# Altium footprint library std-th.PcbLib: 245 footprints (part 7 of 16)
Each footprint in its own frame and in the unit in brackets; x right, y up, seen from the top. Pads: shape width x height; smd on the part's side, far side on the other; paste and mask are expansions set on the pad; w line width, h text height; cw(c..) or ccw(c..) is an arc to the next point about the centre after c.
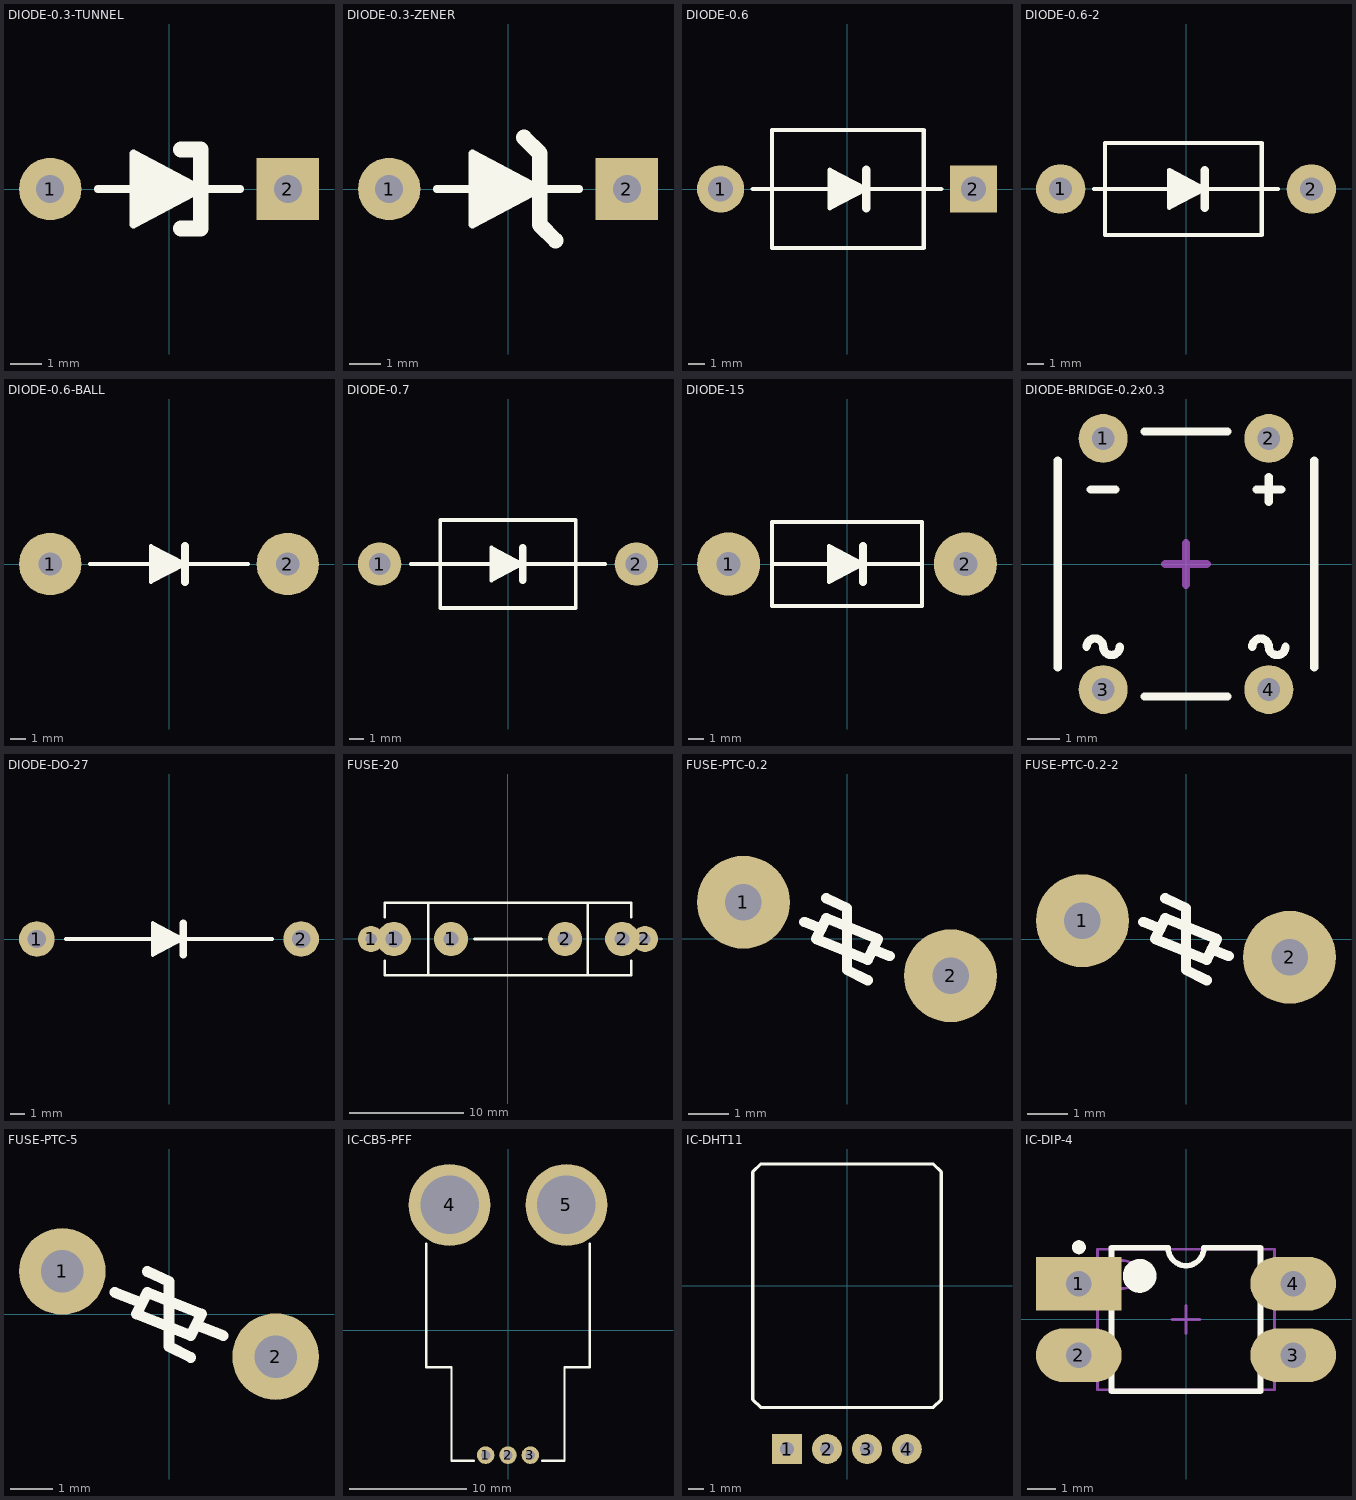
[diagram p6: the footprints below, top view; thin cyan lines are the x and y axes]

## DIODE-0.3-TUNNEL [mm] "Axial Tunnel Diode, Leads 0.3 inch spacing"
height 2.8
pads (2):
  round 2 hole 0.9: 1(-3.81,0)
  rect 2x2 hole 0.9: 2(3.81,0)
Top Overlay:
  region: -1.143,1.143 1.016,0 -1.143,-1.143
  lines w0.254: -2.286,0 2.286,0 ; -1.143,-1.143 -1.143,1.143 1.016,0 -1.143,-1.143
  lines w0.508: 0.381,-1.27 1.016,-1.27 1.016,1.27 0.381,1.27
3D body: height 3.06, standoff -1.27, extent -4.204,-1.333 4.204,1.334

## DIODE-0.3-ZENER [mm] "Axial Zener Diode, Leads 0.3 inch spacing"
height 2.8
pads (2):
  round 2 hole 0.9: 1(-3.81,0)
  rect 2x2 hole 0.9: 2(3.81,0)
Top Overlay:
  region: -1.143,1.143 1.016,0 -1.143,-1.143
  lines w0.254: -2.286,0 2.286,0 ; -1.143,-1.143 -1.143,1.143 1.016,0 -1.143,-1.143
  lines w0.508: 0.508,1.651 1.016,1.143 1.016,-1.143 1.524,-1.651
3D body: height 2.46, standoff -2, extent -4.07,-0.96 4.07,0.96

## DIODE-0.6 [mil] "Diode, Axial Diode, Leads 0.6 inch spacing"
height 275.59
pads (2):
  round 110 hole 59.06: 1(-295.28,0)
  rect 110x110 hole 59.06: 2(295.28,0)
Top Overlay:
  region: -40,45 45,0 -40,-45
  lines w10: -220,0 -177.17,0 ; -182.01,0 192,-0.01 ; 177.17,0 220,0 ; -175,-137.52 179.33,-137.52 179.33,137.52 -175,137.52 -175,-137.52 ; -40,-45 -40,45 45,0 -40,-45
  lines w20: 45,-45 45,45
3D body: height 226.38, standoff -59.06, extent -321.85,-88.59 321.85,88.58
3D body: height 274.5, standoff 0, extent -175,-137.52 179.33,137.52
3D body: height 275.09, standoff -0.2, extent 115,-137.92 154.37,137.92

## DIODE-0.6-2 [mm] "DO-201AD"
height 5
pads (2):
  round 3 hole 1.4: 1(-7.62,0) 2(7.62,0)
Top Overlay:
  region: -1.016,1.149 1.143,0.006 -1.016,-1.137
  lines w0.254: -5.588,0.006 -4.5,0.006 ; -5.461,0.006 -4.92,0 ; -4.623,0.006 4.877,0.006 ; 4.5,0.006 5.588,0.006 ; 4.61,0.006 5.334,0.006 ; -4.92,-2.8 -4.92,2.8 4.61,2.8 4.61,-2.788 -4.92,-2.8 ; -1.016,-1.137 -1.016,1.149 1.143,0.006 -1.016,-1.137
  lines w0.508: 1.143,-1.137 1.143,1.149
3D body: height 7.6, standoff -4, extent -8.28,-2.8 8.28,2.8

## DIODE-0.6-BALL [mm] "Ball Power diode, 600 mil pitch"
pads (2):
  round 4 hole 1.5: 1(-7.62,0) 2(7.62,0)
Top Overlay:
  region: -1.143,1.143 1.016,0 -1.143,-1.143
  lines w0.254: -5.08,0 5.08,0 ; -1.143,-1.143 -1.143,1.143 1.016,0 -1.143,-1.143
  lines w0.508: 1.016,-1.143 1.016,1.143
3D body: height 5.25, standoff -2, extent -8.175,-2.25 8.175,2.25

## DIODE-0.7 [mm] "Power diode, 700 mil pitch"
pads (2):
  round 3 hole 1.5: 1(-8.89,0) 2(8.89,0)
Top Overlay:
  region: -1.143,1.143 1.016,0 -1.143,-1.143
  lines w0.254: -6.731,0 6.731,0 ; -4.699,-3.048 -4.699,3.048 4.699,3.048 4.699,-3.048 -4.699,-3.048 ; -1.143,-1.143 1.016,0 -1.143,1.143 -1.143,-1.143
  lines w0.508: 1.016,-1.143 1.016,1.143
3D body: height 6.22, standoff -2, extent -9.525,-3.112 9.525,3.113

## DIODE-15 [mm] "Power diode, 15 mm pitch"
pads (2):
  round 4 hole 1.5: 1(-7.5,0) 2(7.5,0)
Top Overlay:
  region: -1.143,1.143 1.016,0 -1.143,-1.143
  lines w0.254: -4.75,0 4.75,0 ; -4.75,-2.667 -4.75,2.667 4.75,2.667 4.75,-2.667 -4.75,-2.667 ; -1.143,-1.143 -1.143,1.143 1.016,0 -1.143,-1.143
  lines w0.508: 1.016,-1.143 1.016,1.143
3D body: height 5.3, standoff -3.35, extent -8.15,-2.65 8.15,2.65

## DIODE-BRIDGE-0.2x0.3 [mm] "Bridge rectifier, 200 mil pitch, 300 mil row spacing"
height 8
pads (4):
  round 1.5 hole 0.7: 1(-2.54,3.85) 2(2.54,3.85) 3(-2.54,-3.85) 4(2.54,-3.85)
Top Overlay:
  lines w0.254: -3.937,-3.175 -3.937,3.175 ; -3.048,-2.54 cw(c-2.794,-2.54) -2.54,-2.54 ccw(c-2.286,-2.54) -2.032,-2.54 ; -2.921,2.286 -2.159,2.286 ; -1.27,-4.064 1.27,-4.064 ; -1.27,4.064 1.27,4.064 ; 2.032,-2.54 cw(c2.286,-2.54) 2.54,-2.54 ccw(c2.794,-2.54) 3.048,-2.54 ; 2.159,2.286 2.921,2.286 ; 2.54,1.905 2.54,2.667 ; 3.937,-3.175 3.937,3.175
Mechanical 15:
  lines w0.254: -0.635,0 0.635,0 ; 0,-0.635 0,0.635
3D body: height 3.8, standoff -2.7, extent -3.85,-3.993 3.85,3.99

## DIODE-DO-27 [mm] "Diode, DO-27 / DO-201AD"
height 5
pads (2):
  round 2.54 hole 1.3: 1(-9.42,0) 2(9.42,0)
Top Overlay:
  region: -1.143,1.143 1.016,0 -1.143,-1.143
  lines w0.254: -7.366,0 7.366,0 ; -1.143,-1.143 -1.143,1.143 1.016,0 -1.143,-1.143
  lines w0.508: 1.016,-1.143 1.016,1.143
3D body: height 5.99, standoff -3.62, extent -10.07,-2.82 10.07,2.82

## FUSE-20 [mm] "Fuse, through hole, 4 pin, 10 mm pitch"
height 8
pads (6):
  round 2.286 hole 1: 1(-12,0) 2(12,0)
  round 3 hole 1.5: 1(-10,0)
  round 3 hole 1.3: 1(-5,0) 2(5,0) 2(10,0)
Top Overlay:
  lines w0.254: -10.795,-1.905 -10.795,-3.175 10.795,-3.175 10.795,-1.905 ; -10.795,1.905 -10.795,3.175 10.795,3.175 10.795,1.905 ; -6.985,-3.175 -6.985,3.175 ; -2.921,0 2.921,0 ; 6.985,-3.175 6.985,3.175
3D body: height 9.59, standoff -3.31, extent -10.639,-3.142 10.639,3.048

## FUSE-PTC-0.2 [mil] "Polyfuse, 200 mil pitch"
height 314.96
pads (2):
  round 90 hole 35.43: 1(-100.4,35.63) 2(100.39,-35.63)
Top Overlay:
  lines w10: -41.38,16.55 -25,10 ; -20,39.37 0,30 0,-30 20,-40 ; 25,-10 41.38,-16.55 ; -30,0 -20,20 30,0 20,-20 -30,0
3D body: height 720.47, standoff -299.21, extent -236.21,-55.5 236.23,55.51

## FUSE-PTC-0.2-2 [mil] "Polyfuse, 200 mil pitch"
height 314.96
pads (2):
  round 90 hole 35.43: 1(-100.39,17.72) 2(100.39,-17.72)
Top Overlay:
  lines w10: -41.38,16.55 -25,10 ; -20,39.37 0,30 0,-30 20,-40 ; 25,-10 41.38,-16.55 ; -30,0 20,-20 30,0 -20,20 -30,0
3D body: height 588.58, standoff -128.76, extent -145.66,-33.46 145.68,33.48

## FUSE-PTC-5 [mm] "Resettable fuse, PTC, 5 mm pitch"
height 15
pads (2):
  round 2.032 hole 1: 1(-2.5,1) 2(2.5,-1)
Top Overlay:
  lines w0.254: -1.27,0.508 -0.635,0.254 ; -0.508,1 0,0.762 0,-0.762 0.508,-1.016 ; 0.635,-0.254 1.27,-0.508 ; -0.762,0 -0.508,0.508 0.762,0 0.508,-0.508 -0.762,0
3D body: height 15.68, standoff -3.02, extent -5.1,-1.5 5.1,1.5

## IC-CB5-PFF [mm] "Package CB, 5-pin, right angle"
height 7
pads (5):
  round 1.5 hole 0.8: 1(-1.91,-10.7) 2(0,-10.7) 3(1.91,-10.7)
  round 7 hole 5: 4(-5,10.7) 5(5,10.7)
Top Overlay:
  lines w0.203: -6.985,7.366 -6.985,-3.175 -4.826,-3.175 -4.826,-11.176 -2.921,-11.176 ; 2.921,-11.176 4.826,-11.176 4.826,-3.175 6.985,-3.175 6.985,7.366
3D body: height 7, standoff -3.51, extent -7,-11.2 7,11.622

## IC-DHT11 [mm] "DHT11 Temperature & Humidity Sensor"
height 5.5
pads (4):
  rect 1.905x1.905 hole 0.9: 1(-3.81,-10.4)
  round 1.905 hole 0.9: 2(-1.27,-10.4) 3(1.27,-10.4) 4(3.81,-10.4)
Top Overlay:
  lines w0.203: -6,7.25 -5.5,7.75 5.5,7.75 ; -6,7.25 -6,7.25 ; -6,7.25 -6,-7.25 -5.5,-7.75 ; -5.5,-7.75 5.5,-7.75 6,-7.25 ; -5.5,-7.75 -5.5,-7.75 ; 5.5,7.75 6,7.25 6,-7.25 ; 5.5,7.75 5.5,7.75 ; 6,-7.25 6,-7.25
3D body: height 5.5, standoff -2.6, extent -6,-10.75 6,7.75

## IC-DIP-4 [mil] "DIP; 4 Leads; Row Spacing 7.62 mm; Pitch 2.54 mm"
height 220.47
pads (4):
  rect 120x75 hole 35.43: 1(-150,50)
  oval 120x75 hole 35.43: 2(-150,-50) 3(150,-50) 4(150,50)
Top Overlay:
  circle w9.84: c-150,101.18 r4.92
  circle w23.62: c-64.96,61.02 r11.81
  lines w7.87: -104.33,-100.39 -104.33,100.39 -25,100.39 ccw(c0,100.39) 25,100.39 104.33,100.39 104.33,-100.39 -104.33,-100.39
Mechanical 13:
  circle w3.94: c-88.58,62.99 r19.68
  lines w3.94: -124.02,-98.43 -124.02,98.43 124.02,98.43 124.02,-98.43 -124.02,-98.43
Mechanical 15:
  lines w3.94: -19.68,0 19.68,0 ; 0,-19.68 0,19.68
3D body: height 169.69, standoff -129.13, extent -157.48,-109.05 157.49,109.06